# Altium footprint library Conectors.PcbLib: 123 footprints (part 3 of 8)
Each footprint in its own frame and in the unit in brackets; x right, y up, seen from the top. Pads: shape width x height; smd on the part's side, far side on the other; paste and mask are expansions set on the pad; w line width, h text height; cw(c..) or ccw(c..) is an arc to the next point about the centre after c.
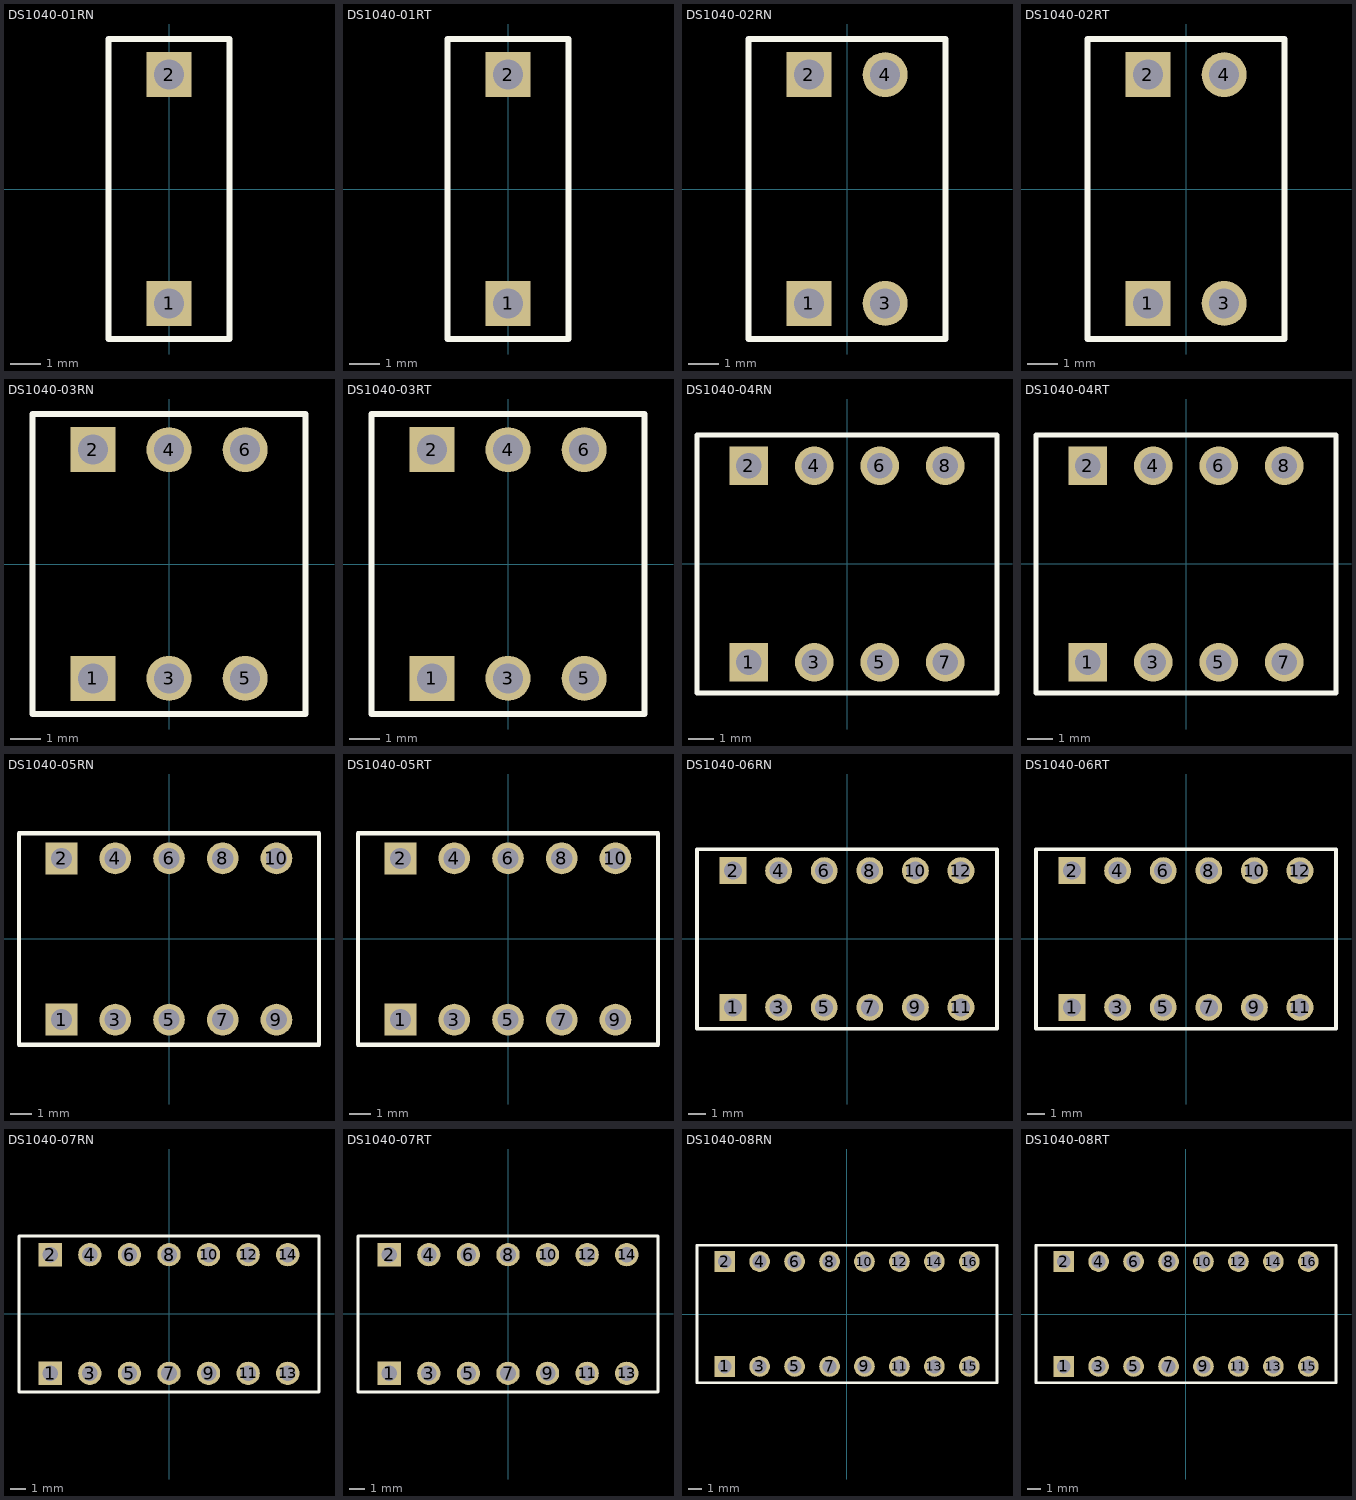
[diagram p2: the footprints below, top view; thin cyan lines are the x and y axes]

## DS1040-01RN [mm]
pads (2):
  rect 1.5x1.5 hole 1: 1(0,-3.81) 2(0,3.81)
Top Overlay:
  lines w0.2: -2.01,-5 -2.01,5 2.01,5 2.01,-5 -2.01,-5
3D body "DS1040-01 (DIP_switch).stp": height 6.8, standoff -3.85, extent -2,-4.95 2,4.95

## DS1040-01RT [mm]
pads (2):
  rect 1.5x1.5 hole 1: 1(0,-3.81) 2(0,3.81)
Top Overlay:
  lines w0.2: -2.01,-5 -2.01,5 2.01,5 2.01,-5 -2.01,-5
3D body "DS1040-01RT.stp": height 8, standoff -3, extent -2,-6.75 2,4.95

## DS1040-02RN [mm]
pads (4):
  rect 1.5x1.5 hole 1: 1(-1.27,-3.81) 2(-1.27,3.81)
  round 1.5 hole 1: 3(1.27,-3.81) 4(1.27,3.81)
Top Overlay:
  lines w0.2: -3.28,-5 3.28,-5 3.28,5 -3.28,5 -3.28,-5
3D body "DS1040-02 (DIP_switch).stp": height 6.8, standoff -3.85, extent -3.27,-4.95 3.27,4.95

## DS1040-02RT [mm]
pads (4):
  rect 1.5x1.5 hole 1: 1(-1.27,-3.81) 2(-1.27,3.81)
  round 1.5 hole 1: 3(1.27,-3.81) 4(1.27,3.81)
Top Overlay:
  lines w0.2: -3.28,-5 3.28,-5 3.28,5 -3.28,5 -3.28,-5
3D body "DS1040-02RT.stp": height 8, standoff -3, extent -3.27,-6.75 3.27,4.95

## DS1040-03RN [mm]
pads (6):
  rect 1.5x1.5 hole 1: 1(-2.54,-3.81) 2(-2.54,3.81)
  round 1.5 hole 1: 3(0,-3.81) 4(0,3.81) 5(2.54,-3.81) 6(2.54,3.81)
Top Overlay:
  lines w0.2: -4.55,-5 -4.55,5 4.55,5 4.55,-5 -4.55,-5
3D body "DS1040-03 (DIP_switch).stp": height 6.8, standoff -3.85, extent -4.54,-4.95 4.54,4.95

## DS1040-03RT [mm]
pads (6):
  rect 1.5x1.5 hole 1: 1(-2.54,-3.81) 2(-2.54,3.81)
  round 1.5 hole 1: 3(0,-3.81) 4(0,3.81) 5(2.54,-3.81) 6(2.54,3.81)
Top Overlay:
  lines w0.2: -4.55,-5 4.55,-5 4.55,5 -4.55,5 -4.55,-5
3D body "DS1040-03RT.stp": height 8, standoff -3, extent -4.54,-6.75 4.54,4.95

## DS1040-04RN [mm]
pads (8):
  rect 1.5x1.5 hole 1: 1(-3.81,-3.81) 2(-3.81,3.81)
  round 1.5 hole 1: 3(-1.27,-3.81) 4(-1.27,3.81) 5(1.27,-3.81) 6(1.27,3.81) 7(3.81,-3.81) 8(3.81,3.81)
Top Overlay:
  lines w0.2: 5.82,4.99 5.82,-5 -5.82,-5 -5.82,5 5.82,5
3D body "DS1040-04 (DIP_switch).stp": height 6.8, standoff -3.85, extent -5.81,-4.95 5.81,4.95

## DS1040-04RT [mm]
pads (8):
  rect 1.5x1.5 hole 1: 1(-3.81,-3.81) 2(-3.81,3.81)
  round 1.5 hole 1: 3(-1.27,-3.81) 4(-1.27,3.81) 5(1.27,-3.81) 6(1.27,3.81) 7(3.81,-3.81) 8(3.81,3.81)
Top Overlay:
  lines w0.2: 5.82,4.99 5.82,-5 -5.82,-5 -5.82,5 5.82,5
3D body "DS1040-04RT.stp": height 8, standoff -3, extent -5.81,-6.75 5.81,4.95

## DS1040-05RN [mm]
pads (10):
  rect 1.5x1.5 hole 1: 1(-5.08,-3.81) 2(-5.08,3.81)
  round 1.5 hole 1: 3(-2.54,-3.81) 4(-2.54,3.81) 5(0,-3.81) 6(0,3.81) 7(2.54,-3.81) 8(2.54,3.81) 9(5.08,-3.81) 10(5.08,3.81)
Top Overlay:
  lines w0.2: -7.09,-5 7.09,-5 7.09,4.99 ; -7.09,-4.99 -7.09,5 7.09,5
3D body "DS1040-05 (DIP_switch).stp": height 6.8, standoff -3.85, extent -7.08,-4.95 7.08,4.95

## DS1040-05RT [mm]
pads (10):
  rect 1.5x1.5 hole 1: 1(-5.08,-3.81) 2(-5.08,3.81)
  round 1.5 hole 1: 3(-2.54,-3.81) 4(-2.54,3.81) 5(0,-3.81) 6(0,3.81) 7(2.54,-3.81) 8(2.54,3.81) 9(5.08,-3.81) 10(5.08,3.81)
Top Overlay:
  lines w0.2: -7.09,-5 7.09,-5 7.09,4.99 ; -7.09,-4.99 -7.09,5 7.09,5
3D body "DS1040-05RT.stp": height 8, standoff -3, extent -7.08,-6.75 7.08,4.95

## DS1040-06RN [mm]
pads (12):
  rect 1.5x1.5 hole 1: 1(-6.35,-3.81) 2(-6.35,3.81)
  round 1.5 hole 1: 3(-3.81,-3.81) 4(-3.81,3.81) 5(-1.27,-3.81) 6(-1.27,3.81) 7(1.27,-3.81) 8(1.27,3.81) 9(3.81,-3.81) 10(3.81,3.81) 11(6.35,-3.81) 12(6.35,3.81)
Top Overlay:
  lines w0.2: -8.36,-5 8.36,-5 8.36,4.99 ; -8.36,-4.99 -8.36,5 8.36,5
3D body "DS1040-06 (DIP_switch).stp": height 6.8, standoff -3.85, extent -8.35,-4.95 8.35,4.95

## DS1040-06RT [mm]
pads (12):
  rect 1.5x1.5 hole 1: 1(-6.35,-3.81) 2(-6.35,3.81)
  round 1.5 hole 1: 3(-3.81,-3.81) 4(-3.81,3.81) 5(-1.27,-3.81) 6(-1.27,3.81) 7(1.27,-3.81) 8(1.27,3.81) 9(3.81,-3.81) 10(3.81,3.81) 11(6.35,-3.81) 12(6.35,3.81)
Top Overlay:
  lines w0.2: -8.36,-5 8.36,-5 8.36,4.99 ; -8.36,-4.99 -8.36,5 8.36,5
3D body "DS1040-06RT.stp": height 8, standoff -3, extent -8.35,-6.75 8.35,4.95

## DS1040-07RN [mm]
pads (14):
  rect 1.5x1.5 hole 1: 1(-7.62,-3.81) 2(-7.62,3.81)
  round 1.5 hole 1: 3(-5.08,-3.81) 4(-5.08,3.81) 5(-2.54,-3.81) 6(-2.54,3.81) 7(0,-3.81) 8(0,3.81) 9(2.54,-3.81) 10(2.54,3.81) 11(5.08,-3.81) 12(5.08,3.81) 13(7.62,-3.81) 14(7.62,3.81)
Top Overlay:
  lines w0.2: -9.63,-5 9.63,-5 9.63,4.99 ; -9.63,-4.99 -9.63,5 9.62,5
3D body "DS1040-07 (DIP_switch).stp": height 6.8, standoff -3.85, extent -9.62,-4.95 9.62,4.95

## DS1040-07RT [mm]
pads (14):
  rect 1.5x1.5 hole 1: 1(-7.62,-3.81) 2(-7.62,3.81)
  round 1.5 hole 1: 3(-5.08,-3.81) 4(-5.08,3.81) 5(-2.54,-3.81) 6(-2.54,3.81) 7(0,-3.81) 8(0,3.81) 9(2.54,-3.81) 10(2.54,3.81) 11(5.08,-3.81) 12(5.08,3.81) 13(7.62,-3.81) 14(7.62,3.81)
Top Overlay:
  lines w0.2: -9.63,-5 9.63,-5 9.63,4.99 ; -9.63,-4.99 -9.63,5 9.62,5
3D body "DS1040-07RT.stp": height 8, standoff -3, extent -9.62,-6.75 9.62,4.95

## DS1040-08RN [mm]
pads (16):
  rect 1.5x1.5 hole 1: 1(-8.89,-3.81) 2(-8.89,3.81)
  round 1.5 hole 1: 3(-6.35,-3.81) 4(-6.35,3.81) 5(-3.81,-3.81) 6(-3.81,3.81) 7(-1.27,-3.81) 8(-1.27,3.81) 9(1.27,-3.81) 10(1.27,3.81) 11(3.81,-3.81) 12(3.81,3.81) 13(6.35,-3.81) 14(6.35,3.81) 15(8.89,-3.81) 16(8.89,3.81)
Top Overlay:
  lines w0.2: 10.9,-5 10.9,4.99 ; 10.9,-4.99 -10.9,-4.99 -10.9,5 10.9,5
3D body "DS1040-08 (DIP_switch).stp": height 6.8, standoff -3.85, extent -10.89,-4.95 10.89,4.95

## DS1040-08RT [mm]
pads (16):
  rect 1.5x1.5 hole 1: 1(-8.89,-3.81) 2(-8.89,3.81)
  round 1.5 hole 1: 3(-6.35,-3.81) 4(-6.35,3.81) 5(-3.81,-3.81) 6(-3.81,3.81) 7(-1.27,-3.81) 8(-1.27,3.81) 9(1.27,-3.81) 10(1.27,3.81) 11(3.81,-3.81) 12(3.81,3.81) 13(6.35,-3.81) 14(6.35,3.81) 15(8.89,-3.81) 16(8.89,3.81)
Top Overlay:
  lines w0.2: 10.9,-5 10.9,4.99 ; 10.9,-4.99 -10.9,-4.99 -10.9,5 10.9,5
3D body "DS1040-08RT.stp": height 8, standoff -3, extent -10.89,-6.75 10.89,4.95